# Altium footprint library deep_lib.PcbLib: 35 footprints (part 2 of 3)
Each footprint in its own frame and in the unit in brackets; x right, y up, seen from the top. Pads: shape width x height; smd on the part's side, far side on the other; paste and mask are expansions set on the pad; w line width, h text height; cw(c..) or ccw(c..) is an arc to the next point about the centre after c.
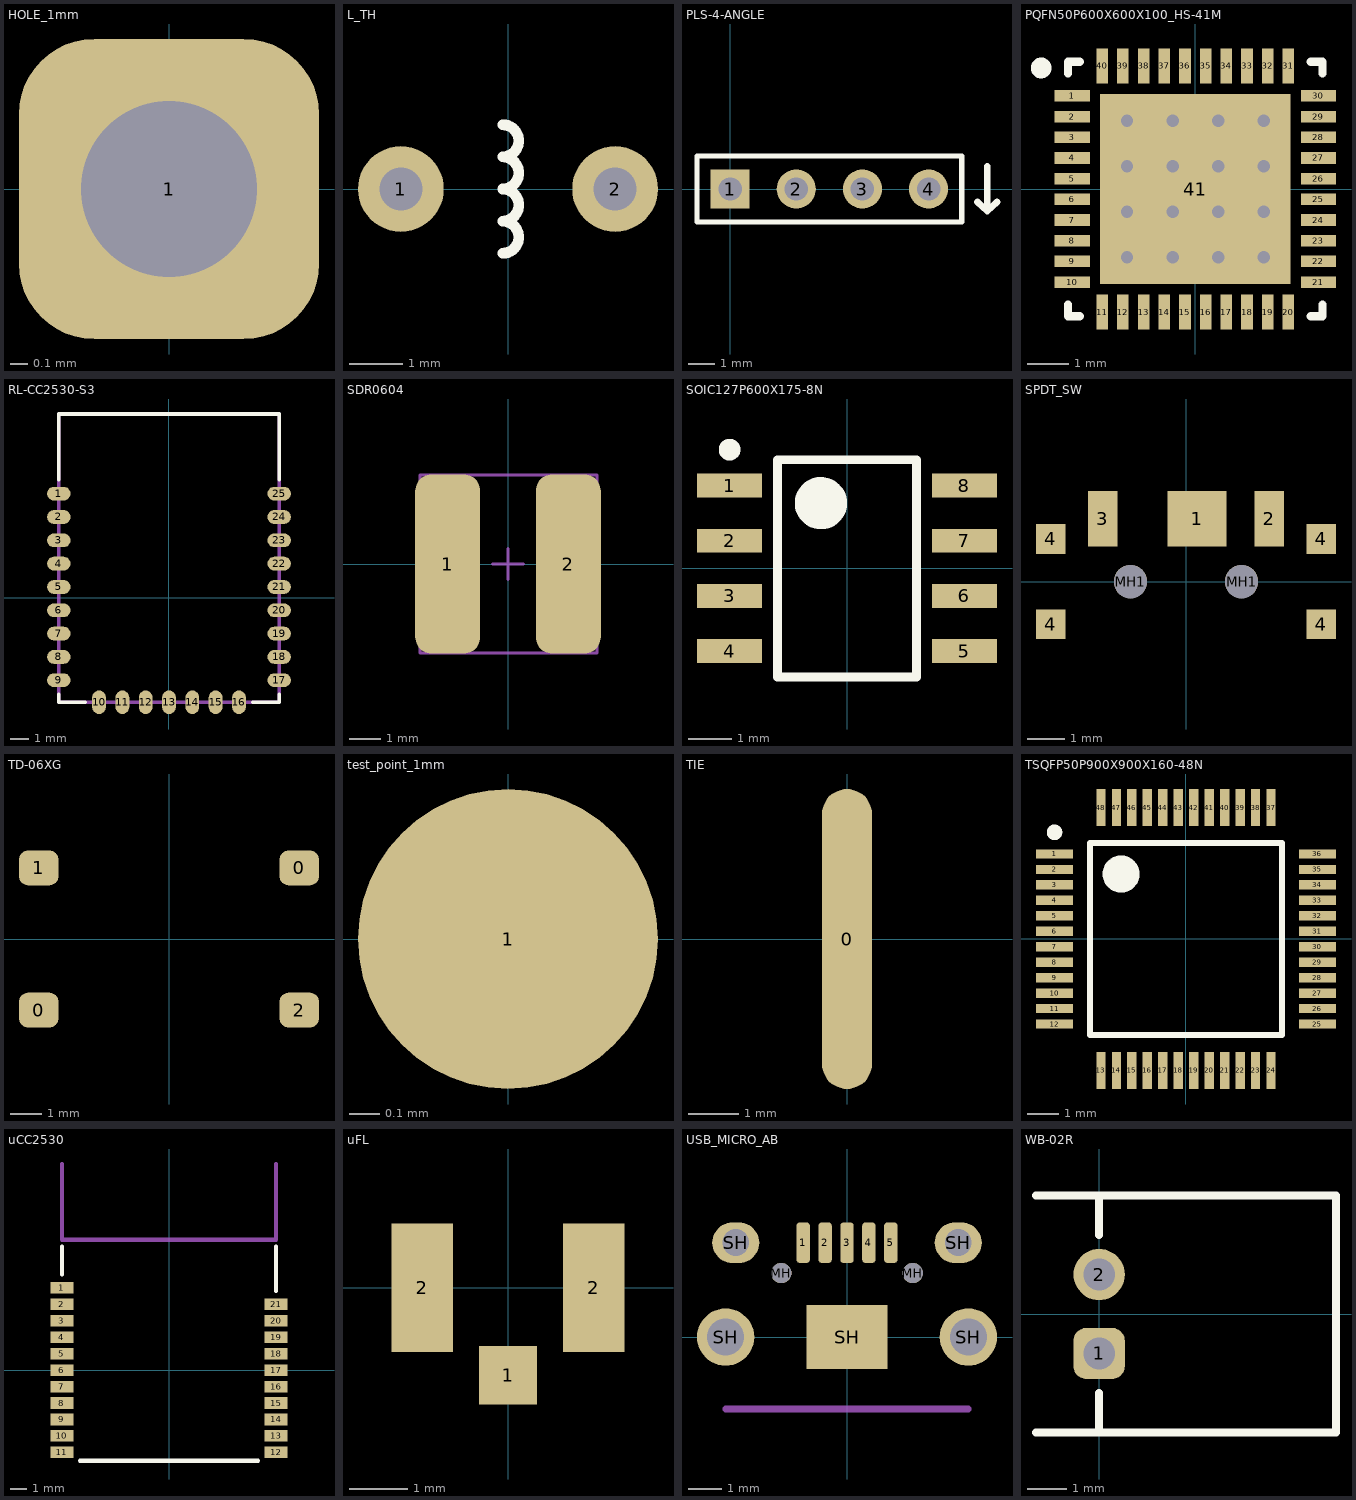
[diagram p1: the footprints below, top view; thin cyan lines are the x and y axes]

## HOLE_1mm [mm]
pads (1):
  rrect50% 1.7x1.7 hole 1: 1(0,0)

## L_TH [mm]
pads (2):
  round 1.6 hole 0.8: 1(-2,0) 2(2,0)
Top Overlay:
  lines w0.2: -0.1,-1.2 ccw(c-0.1,-0.9) -0.1,-0.6 ccw(c-0.1,-0.3) -0.1,0 ccw(c-0.1,0.3) -0.1,0.6 ccw(c-0.1,0.9) -0.1,1.2

## PLS-4-ANGLE [mm] "Connector; Header; 4 Position; Right Angle"
height 12
pads (4):
  rect 1.5x1.5 hole 0.9: 1(0,0)
  round 1.5 hole 0.9: 2(2.54,0) 3(5.08,0) 4(7.62,0)
Top Overlay:
  lines w0.2: -1.27,-1.27 -1.27,1.27 8.89,1.27 8.89,-1.27 ; -1.27,-1.27 8.89,-1.27 ; -1.27,-1.27 8.89,-1.27
  lines w0.254: 9.495,-0.5 9.87,-0.85 ; 9.87,0.875 9.87,-0.85 ; 10.245,-0.5 9.87,-0.85
3D body "PLS-1R.step": height 5.45, standoff -3, extent 6.35,-7.35 8.89,1.27
3D body "PLS-1R.step": height 5.45, standoff -3, extent 3.81,-7.35 6.35,1.27
3D body "PLS-1R.step": height 5.45, standoff -3, extent 1.27,-7.35 3.81,1.27
3D body "PLS-1R.step": height 5.45, standoff -3, extent -1.27,-7.35 1.27,1.27

## PQFN50P600X600X100_HS-41M [mm] "PQFN, 40-Leads, Body 6,00x6,00mm, Pitch 0,50mm, Thermal Pad 4,5x4,5mm, IPC Low Density"
height 1
pads (41):
  rect 0.85x0.28 smd mask+0.07: 1(-2.975,2.25) 2(-2.975,1.75) 3(-2.975,1.25) 4(-2.975,0.75) 5(-2.975,0.25) 6(-2.975,-0.25) 7(-2.975,-0.75) 8(-2.975,-1.25) 9(-2.975,-1.75) 10(-2.975,-2.25) 21(2.975,-2.25) 22(2.975,-1.75) 23(2.975,-1.25) 24(2.975,-0.75) 25(2.975,-0.25) 26(2.975,0.25) 27(2.975,0.75) 28(2.975,1.25) 29(2.975,1.75) 30(2.975,2.25)
  rect 0.28x0.85 smd mask+0.07: 11(-2.25,-2.975) 12(-1.75,-2.975) 13(-1.25,-2.975) 14(-0.75,-2.975) 15(-0.25,-2.975) 16(0.25,-2.975) 17(0.75,-2.975) 18(1.25,-2.975) 19(1.75,-2.975) 20(2.25,-2.975) 31(2.25,2.975) 32(1.75,2.975) 33(1.25,2.975) 34(0.75,2.975) 35(0.25,2.975) 36(-0.25,2.975) 37(-0.75,2.975) 38(-1.25,2.975) 39(-1.75,2.975) 40(-2.25,2.975)
  rect 4.6x4.6 smd: 41(0,0)
via 1.65,-1.65 diameter 0.7 hole 0.3
via 0.55,-1.65 diameter 0.7 hole 0.3
via -0.55,-1.65 diameter 0.7 hole 0.3
via -1.65,-1.65 diameter 0.7 hole 0.3
via 1.65,-0.55 diameter 0.7 hole 0.3
via 0.55,-0.55 diameter 0.7 hole 0.3
via -0.55,-0.55 diameter 0.7 hole 0.3
via -1.65,-0.55 diameter 0.7 hole 0.3
via 1.65,0.55 diameter 0.7 hole 0.3
via 0.55,0.55 diameter 0.7 hole 0.3
via -0.55,0.55 diameter 0.7 hole 0.3
via -1.65,0.55 diameter 0.7 hole 0.3
via 1.65,1.65 diameter 0.7 hole 0.3
via 0.55,1.65 diameter 0.7 hole 0.3
via -0.55,1.65 diameter 0.7 hole 0.3
via -1.65,1.65 diameter 0.7 hole 0.3
Top Overlay:
  circle w0.25: c-3.725,2.925 r0.125
  lines w0.2: -3.075,-2.79 -3.075,-3.075 -2.79,-3.075 ; -3.075,2.79 -3.075,3.075 -2.79,3.075 ; 2.79,-3.075 3.075,-3.075 3.075,-2.79 ; 2.79,3.075 3.075,3.075 3.075,2.79
3D body "User Library-QFN-40.STEP": height 1.05, standoff 0, extent -3.075,-3.075 3.075,3.075

## RL-CC2530-S3 [mm]
height 1.5
pads (25):
  oval 1.28x0.75 smd: 1(-6,5.68) 2(-6,4.41) 3(-6,3.14) 4(-6,1.87) 5(-6,0.6) 6(-6,-0.67) 7(-6,-1.94) 8(-6,-3.21) 9(-6,-4.48) 17(6,-4.48) 18(6,-3.21) 19(6,-1.94) 20(6,-0.67) 21(6,0.6) 22(6,1.87) 23(6,3.14) 24(6,4.41) 25(6,5.68)
  oval 0.75x1.28 smd: 10(-3.81,-5.68) 11(-2.54,-5.68) 12(-1.27,-5.68) 13(0,-5.68) 14(1.27,-5.68) 15(2.54,-5.68) 16(3.81,-5.68)
Top Overlay:
  lines w0.2: -6,-5.245 -6,-5.68 -4.575,-5.68 ; -6,6.445 -6,10.02 6,10.02 6,6.445 ; 4.575,-5.68 6,-5.68 6,-5.245
Mechanical 15:
  lines w0.2: 6,-5.68 6,10.02 -6,10.02 -6,-5.68 6,-5.68 ; 6,-5.68 6,-5.68

## SDR0604 [mm]
pads (2):
  rrect50% 2.1x5.8 smd: 1(-1.95,0) 2(1.95,0)
Mechanical 15:
  lines w0.1: -0.5,0 0.5,0 ; 0,-0.5 0,0.5 ; -2.85,-2.875 -2.85,2.875 2.875,2.875 2.875,-2.875 -2.85,-2.875
3D body "User Library-SDR0604.step": height 4.55, standoff 0, extent -2.754,-2.8 2.754,2.8

## SOIC127P600X175-8N [mm] "SOIC, 8-Leads, Body 4,90x3,90mm, Pitch 1,27mm, IPC Medium Density"
height 1.75
pads (8):
  rect 1.5x0.55 smd: 1(-2.7,1.905) 2(-2.7,0.635) 3(-2.7,-0.635) 4(-2.7,-1.905) 5(2.7,-1.905) 6(2.7,-0.635) 7(2.7,0.635) 8(2.7,1.905)
Top Overlay:
  circle w0.6: c-0.6,1.5 r0.3
  circle w0.25: c-2.7,2.73 r0.125
  lines w0.2: -1.6,-2.5 1.6,-2.5 1.6,2.5 -1.6,2.5 -1.6,-2.5
3D body "User Library-SOIC-8-1.step": height 1.75, standoff 0, extent -3,-2.45 3,2.45

## SPDT_SW [mm]
pads (9):
  rect 1.6x1.5 smd: 1(0.3,1.7)
  rect 0.8x1.5 smd: 2(2.25,1.7) 3(-2.25,1.7)
  rect 0.8x0.8 smd: 4(-3.65,-1.15) 4(-3.65,1.15) 4(3.65,-1.15) 4(3.65,1.15)
  round 0.9 hole 0.9 unplated: MH1(-1.5,0) MH1(1.5,0)

## TD-06XG [mm]
height 4
pads (4):
  rrect50% 1.25x1.1 smd: 0(-4.125,-2.25) 0(4.125,2.25) 1(-4.125,2.25) 2(4.125,-2.25)

## test_point_1mm [mm]
pads (1):
  round 1 smd: 1(0,0)

## TIE [mm]
pads (1):
  oval 1x6 smd: 0(0,0)

## TSQFP50P900X900X160-48N [mm] "TSQFP, 48-Leads, Body 7,00x7,00mm, Pitch 0,50mm, IPC Medium Density"
height 1.6
pads (48):
  rect 1.2x0.3 smd: 1(-4.25,2.75) 2(-4.25,2.25) 3(-4.25,1.75) 4(-4.25,1.25) 5(-4.25,0.75) 6(-4.25,0.25) 7(-4.25,-0.25) 8(-4.25,-0.75) 9(-4.25,-1.25) 10(-4.25,-1.75) 11(-4.25,-2.25) 12(-4.25,-2.75) 25(4.25,-2.75) 26(4.25,-2.25) 27(4.25,-1.75) 28(4.25,-1.25) 29(4.25,-0.75) 30(4.25,-0.25) 31(4.25,0.25) 32(4.25,0.75) 33(4.25,1.25) 34(4.25,1.75) 35(4.25,2.25) 36(4.25,2.75)
  rect 0.3x1.2 smd: 13(-2.75,-4.25) 14(-2.25,-4.25) 15(-1.75,-4.25) 16(-1.25,-4.25) 17(-0.75,-4.25) 18(-0.25,-4.25) 19(0.25,-4.25) 20(0.75,-4.25) 21(1.25,-4.25) 22(1.75,-4.25) 23(2.25,-4.25) 24(2.75,-4.25) 37(2.75,4.25) 38(2.25,4.25) 39(1.75,4.25) 40(1.25,4.25) 41(0.75,4.25) 42(0.25,4.25) 43(-0.25,4.25) 44(-0.75,4.25) 45(-1.25,4.25) 46(-1.75,4.25) 47(-2.25,4.25) 48(-2.75,4.25)
Top Overlay:
  circle w0.25: c-4.25,3.45 r0.125
  circle w0.6: c-2.1,2.1 r0.3
  lines w0.2: -3.1,-3.1 -3.1,3.1 3.1,3.1 3.1,-3.1 -3.1,-3.1
3D body "User Library-LQFP48_Grid_0_5.STEP": height 1.6, standoff 0, extent -4.5,-4.5 4.5,4.5

## uCC2530 [mm]
height 1.5
pads (21):
  rect 1.4x0.7 smd: 1(-6.5,5) 2(-6.5,4) 3(-6.5,3) 4(-6.5,2) 5(-6.5,1) 6(-6.5,0) 7(-6.5,-1) 8(-6.5,-2) 9(-6.5,-3) 10(-6.5,-4) 11(-6.5,-5) 12(6.5,-5) 13(6.5,-4) 14(6.5,-3) 15(6.5,-2) 16(6.5,-1) 17(6.5,0) 18(6.5,1) 19(6.5,2) 20(6.5,3) 21(6.5,4)
Top Overlay:
  lines w0.254: -6.5,5.8 -6.5,7.5 ; -5.4,-5.5 5.4,-5.5 ; 6.5,4.8 6.5,7.5
Mechanical 15:
  lines w0.254: -6.5,12.5 -6.5,7.9 6.5,7.9 6.5,12.5

## uFL [mm]
pads (3):
  rect 1x1 smd: 1(0,-1.5)
  rect 1.05x2.2 smd: 2(-1.47,0) 2(1.47,0)
3D body "SW3dPS-UFL-R-SMD.STEP": height 1.25, standoff 0, extent -1.7,-1.55 1.7,1.55

## USB_MICRO_AB [mm] "Tom mount usb SD-47590-001"
height 2.5
pads (12):
  rrect50% 0.4x1.2 smd: 1(-1.3,2.8) 2(-0.65,2.8) 3(0,2.8) 4(0.65,2.8) 5(1.3,2.8)
  round 0.6 hole 0.6 unplated: MH(-1.95,1.9) MH(1.95,1.9)
  round 1.7 hole 1.1: SH(-3.6,0) SH(3.6,0)
  oval 1.4x1.2 hole 0.8: SH(-3.3,2.8) SH(3.3,2.8)
  rect 2.4x1.9 smd: SH(0,0)
Mechanical 15:
  lines w0.2: -3.6,-2.13 3.6,-2.13

## WB-02R [mm]
height 4.5
pads (2):
  rrect50% 1.3x1.3 hole 0.8: 1(0,-1)
  round 1.3 hole 0.8: 2(0,1)
Top Overlay:
  lines w0.2: -1.6,-3 6,-3 6,3 -1.6,3 ; 0,-3 0,-2 ; 0,2 0,3